# Altium footprint library PR_COR.PcbLib: 73 footprints (part 4 of 5)
Each footprint in its own frame and in the unit in brackets; x right, y up, seen from the top. Pads: shape width x height; smd on the part's side, far side on the other; paste and mask are expansions set on the pad; w line width, h text height; cw(c..) or ccw(c..) is an arc to the next point about the centre after c.
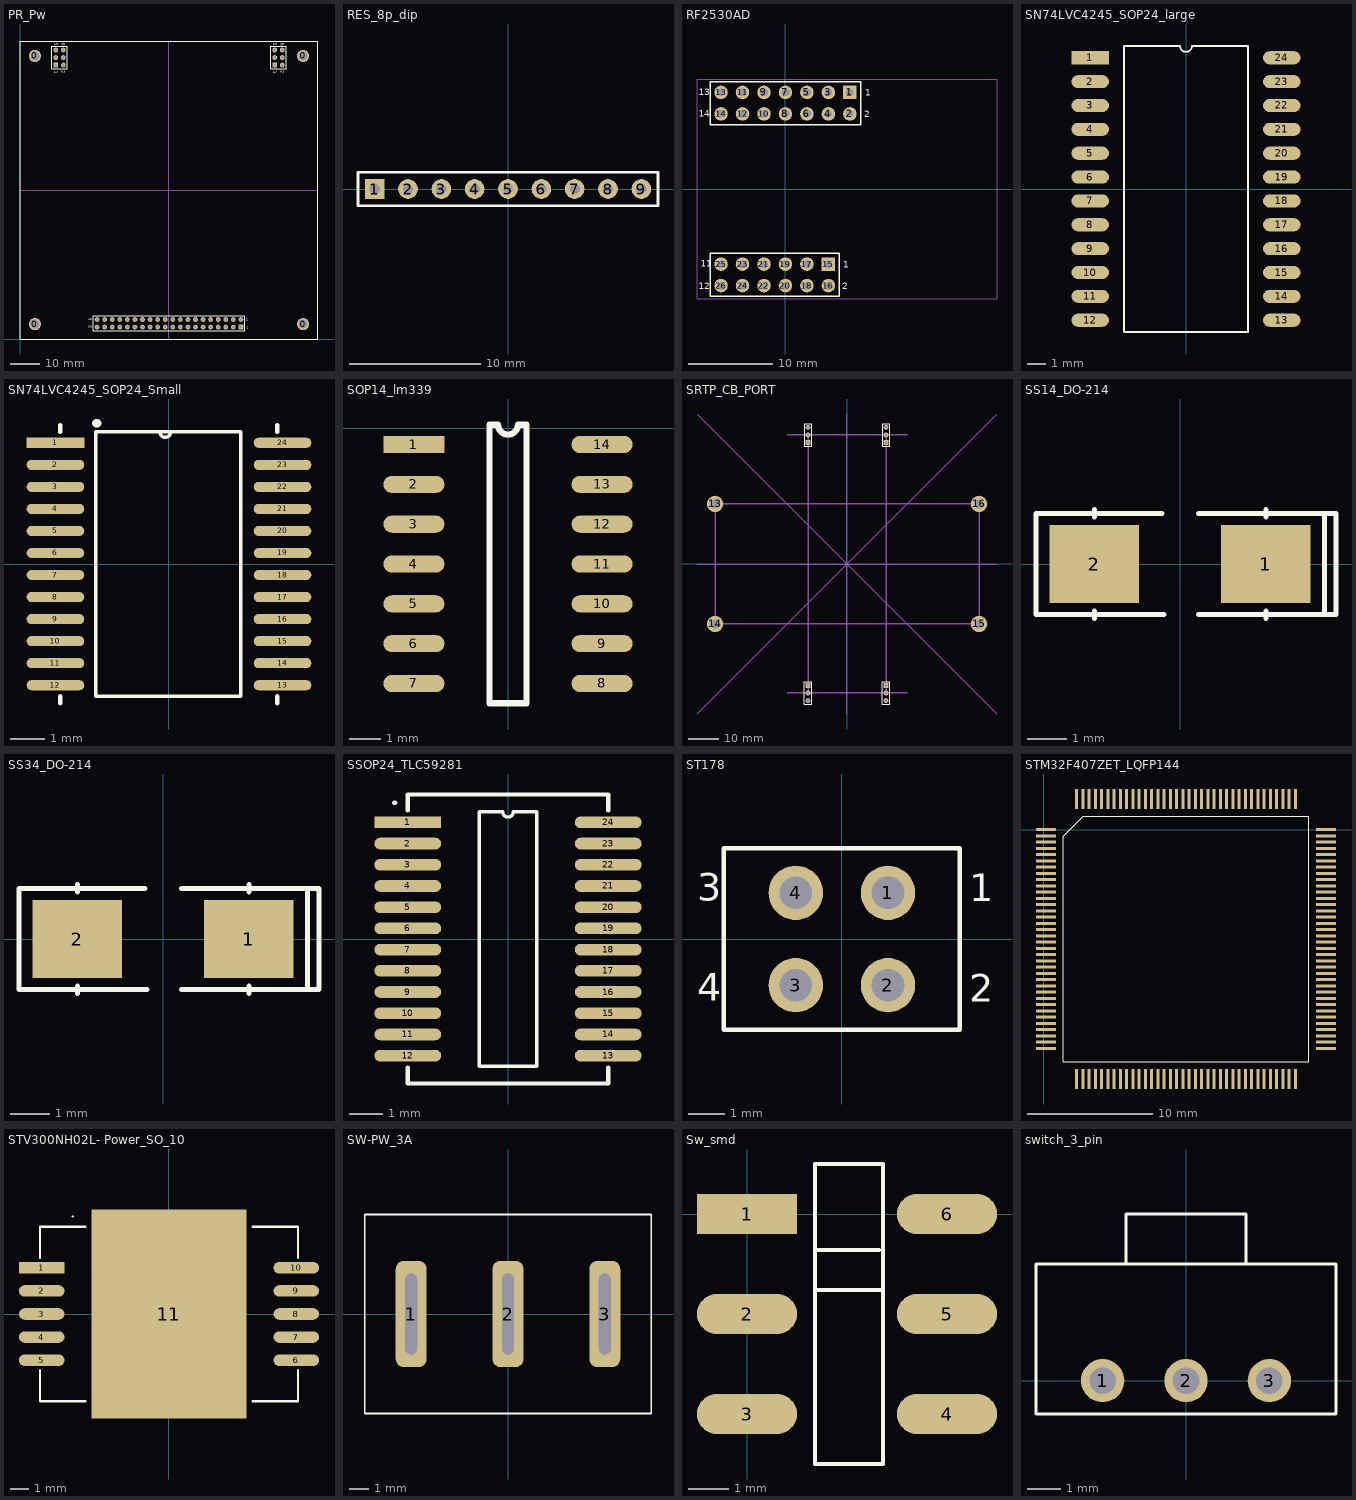
[diagram p3: the footprints below, top view; thin cyan lines are the x and y axes]

## PR_Pw [mm]
pads (56):
  round 4.1 hole 3.1: 0(5,5) 0(5,95) 0(95,5) 0(95,95)
  rect 1.6x1.6 hole 0.9: 1(74.13,4) 41(85.46,91.92) 47(12,91.92)
  round 1.6 hole 0.9: 2(74.13,6.54) 3(71.59,4) 4(71.59,6.54) 5(69.05,4) 6(69.05,6.54) 7(66.51,4) 8(66.51,6.54) 9(63.97,4) 10(63.97,6.54) 11(61.43,4) 12(61.43,6.54) 13(58.89,4) 14(58.89,6.54) 15(56.35,4) 16(56.35,6.54) 17(53.81,4) 18(53.81,6.54) 19(51.27,4) 20(51.27,6.54) 21(48.73,4) 22(48.73,6.54) 23(46.19,4) 24(46.19,6.54) 25(43.65,4) 26(43.65,6.54) 27(41.11,4) 28(41.11,6.54) 29(38.57,4) 30(38.57,6.54) 31(36.03,4) 32(36.03,6.54) 33(33.49,4) 34(33.49,6.54) 35(30.95,4) 36(30.95,6.54) 37(28.41,4) 38(28.41,6.54) 39(25.87,4) 40(25.87,6.54) 42(88,91.92) 43(85.46,94.46) 44(88,94.46) 45(85.46,97) 46(88,97) 48(14.54,91.92) 49(12,94.46) 50(14.54,94.46) 51(12,97) 52(14.54,97)
Top Overlay:
  lines w0.1: 0,0 0,100 100,100 100,0 0,0
  lines w0.2: 10.73,93.402 10.73,98.27 ; 84.19,93.402 84.19,98.27 ; 10.73,98.27 15.81,98.27 15.81,90.65 10.73,90.65 10.73,98.27 ; 84.19,98.27 89.27,98.27 89.27,90.65 84.19,90.65 84.19,98.27 ; 24.6,2.73 75.4,2.73 75.4,7.81 24.6,7.81 24.6,2.73
  text "1" at 84.952,90.078 h1.27
  text "2" at 87.492,90.27 h1.27
  text "5" at 84.952,99.414 h1.27
  text "6" at 87.492,99.414 h1.27
  text "1" at 11.492,90.078 h1.27
  text "2" at 14.032,90.27 h1.27
  text "5" at 11.492,99.414 h1.27
  text "6" at 14.032,99.414 h1.27
  text "1" at 76.03,3.5 h0.76
  text "2" at 75.86,6.1 h0.76
  text "40" at 22.94,6.3 h0.76
  text "39" at 22.948,3.692 h0.76
Bottom Overlay:
  lines w0.2: 24.6,2.73 24.6,7.81 75.4,7.81 75.4,2.73 24.6,2.73
  text "39" at 24.15,3.69 h0.76
  text "40" at 24.15,6.29 h0.76
  text "2" at 76.4,6.1 h0.76
  text "1" at 76.146,3.5 h0.76
Mechanical 2:
  lines w0.1: 0,50 100,50 ; 50,0 50,100
3D body: height 8.02, standoff -2.98, extent 10.73,90.65 15.81,98.27
3D body: height 8.02, standoff -2.98, extent 84.19,90.65 89.27,98.27
3D body: height 8.02, standoff -2.98, extent 24.6,2.73 75.4,7.81

## RES_8p_dip [mm] "Connector; Header; 9 Position"
pads (9):
  rect 1.5x1.5 hole 0.8: 1(-10.16,0)
  round 1.5 hole 0.8: 2(-7.62,0) 3(-5.08,0) 4(-2.54,0) 5(0,0) 6(2.54,0) 7(5.08,0) 8(7.62,0) 9(10.16,0)
Top Overlay:
  lines w0.2: -11.43,-1.27 11.43,-1.27 11.43,1.27 -11.43,1.27 -11.43,-1.27
3D body: height 3.02, standoff -2.48, extent -11.43,-0.75 11.43,0.75

## RF2530AD [mm] "Connector; Header; 14x2 Position"
pads (26):
  rect 1.6x1.6 hole 0.9: 1(7.62,11.42) 15(5.08,-8.88)
  round 1.6 hole 0.9: 2(7.62,8.88) 3(5.08,11.42) 4(5.08,8.88) 5(2.54,11.42) 6(2.54,8.88) 7(0,11.42) 8(0,8.88) 9(-2.54,11.42) 10(-2.54,8.88) 11(-5.08,11.42) 12(-5.08,8.88) 13(-7.62,11.42) 14(-7.62,8.88) 16(5.08,-11.42) 17(2.54,-8.88) 18(2.54,-11.42) 19(0,-8.88) 20(0,-11.42) 21(-2.54,-8.88) 22(-2.54,-11.42) 23(-5.08,-8.88) 24(-5.08,-11.42) 25(-7.62,-8.88) 26(-7.62,-11.42)
Top Overlay:
  lines w0.2: -8.89,-12.69 -8.89,-7.61 6.35,-7.61 6.35,-12.69 -8.89,-12.69 ; -8.89,7.61 -8.89,12.69 8.89,12.69 8.89,7.61 -8.89,7.61
  text "2" at 9.33,8.46 h0.76
  text "1" at 9.44,11.03 h0.76
  text "14" at -10.254,8.57 h0.76
  text "13" at -10.254,11.1 h0.76
  text "12" at -10.254,-11.87 h0.76
  text "11" at -10,-9.21 h0.76
  text "1" at 6.83,-9.31 h0.76
  text "2" at 6.74,-11.86 h0.76
Mechanical 2:
  lines w0.127: -10.46,-13 -10.46,13 25.01,13 25.01,-13 -10.46,-13

## SN74LVC4245_SOP24_large [mm]
pads (24):
  rect 2x0.7 smd: 1(-5.1,6.985)
  oval 2x0.7 smd: 2(-5.1,5.715) 3(-5.1,4.445) 4(-5.1,3.175) 5(-5.1,1.905) 6(-5.1,0.635) 7(-5.1,-0.635) 8(-5.1,-1.905) 9(-5.1,-3.175) 10(-5.1,-4.445) 11(-5.1,-5.715) 12(-5.1,-6.985) 13(5.1,-6.985) 14(5.1,-5.715) 15(5.1,-4.445) 16(5.1,-3.175) 17(5.1,-1.905) 18(5.1,-0.635) 19(5.1,0.635) 20(5.1,1.905) 21(5.1,3.175) 22(5.1,4.445) 23(5.1,5.715) 24(5.1,6.985)
Top Overlay:
  lines w0.1: -3.295,-7.62 3.295,-7.62 3.295,7.62 0.318,7.62 cw(c0,7.62) -0.318,7.62 -3.295,7.62 -3.295,-7.62
3D body: height 1.65, standoff 0, extent -5.1,-7.69 5.2,7.71

## SN74LVC4245_SOP24_Small [mm]
pads (24):
  rect 1.7x0.3 smd: 1(-3.35,3.575)
  oval 1.7x0.3 smd: 2(-3.35,2.925) 3(-3.35,2.275) 4(-3.35,1.625) 5(-3.35,0.975) 6(-3.35,0.325) 7(-3.35,-0.325) 8(-3.35,-0.975) 9(-3.35,-1.625) 10(-3.35,-2.275) 11(-3.35,-2.925) 12(-3.35,-3.575) 13(3.35,-3.575) 14(3.35,-2.925) 15(3.35,-2.275) 16(3.35,-1.625) 17(3.35,-0.975) 18(3.35,-0.325) 19(3.35,0.325) 20(3.35,0.975) 21(3.35,1.625) 22(3.35,2.275) 23(3.35,2.925) 24(3.35,3.575)
Top Overlay:
  lines w0.1: -0.272,3.899 ccw(c-0.11,3.9) 0.053,3.9 ; -2.16,-3.9 -2.16,3.9 2.12,3.9 2.12,-3.9 -2.16,-3.9
  lines w0.127: -3.21,-4.11 -3.21,-3.905 ; -3.21,3.895 -3.21,4.1 ; 3.19,-4.11 3.19,-3.905 ; 3.19,3.895 3.19,4.1
  lines w0.254: -2.15,4.15 -2.12,4.15
3D body: height 0.95, standoff 0, extent -3.21,-3.905 3.19,3.895

## SOP14_lm339 [mm]
pads (14):
  rect 1.95x0.55 smd: 1(-3,-0.525)
  oval 1.95x0.55 smd: 2(-3,-1.795) 3(-3,-3.065) 4(-3,-4.335) 5(-3,-5.605) 6(-3,-6.875) 7(-3,-8.145) 8(3,-8.145) 9(3,-6.875) 10(3,-5.605) 11(3,-4.335) 12(3,-3.065) 13(3,-1.795) 14(3,-0.525)
Top Overlay:
  lines w0.2: -0.59,-8.78 0.59,-8.78 0.59,0.11 0.318,0.11 cw(c0,0.11) -0.317,0.11 -0.59,0.11 -0.59,-8.78
3D body: height 1.67, standoff 0.02, extent -3,-8.65 3,0

## SRTP_CB_PORT [mm]
pads (16):
  round 1.6 hole 0.9: 1(-13,45.54) 2(-13,43) 5(-13,-43) 6(-13,-45.54) 7(13,-45.54) 8(13,-43) 11(13,43) 12(13,45.54)
  rect 1.6x1.6 hole 0.9: 3(-13,40.46) 4(-13,-40.46) 9(13,-40.46) 10(13,40.46)
  round 5.5 hole 3: 13(-44,20) 14(-44,-20) 15(44,-20) 16(44,20)
Top Overlay:
  lines w0.2: -14.27,-46.81 -14.27,-39.19 -11.73,-39.19 -11.73,-46.81 -14.27,-46.81 ; -14.27,39.19 -14.27,46.81 -11.73,46.81 -11.73,39.19 -14.27,39.19 ; 11.73,-46.81 11.73,-39.19 14.27,-39.19 14.27,-46.81 11.73,-46.81 ; 11.73,39.19 11.73,46.81 14.27,46.81 14.27,39.19 11.73,39.19
Mechanical 2:
  lines w0.1: -50.002,-50.002 49.998,49.998 ; -50.002,-0.002 49.998,-0.002 ; -50.002,49.998 49.998,-50.002 ; -0.002,-50.002 -0.002,49.998
  lines w0.5: -44,-20 -44,20 44,20 44,-20 -44,-20
Mechanical 3:
  lines w0.5: -20,-43 20,-43 ; -20,43 20,43 ; -13,-43 -13,43 ; 13,-43 13,43
3D body: height 8.02, standoff -2.98, extent -14.27,39.19 -11.73,46.81
3D body: height 8.02, standoff -2.98, extent -14.27,-46.81 -11.73,-39.19
3D body: height 8.02, standoff -2.98, extent 11.73,-46.81 14.27,-39.19
3D body: height 8.02, standoff -2.98, extent 11.73,39.19 14.27,46.81

## SS14_DO-214 [mm]
height 1
pads (2):
  rect 2.3x2 smd: 1(2.2,0) 2(-2.2,0)
Top Overlay:
  lines w0.127: -2.2,-1.4 -2.2,-1.2 ; -2.2,1.2 -2.2,1.4 ; -0.466,1.3 -3.7,1.3 -3.7,-1.3 -0.416,-1.3 ; 0.47,-1.3 3.7,-1.3 3.7,1.3 ; 0.47,1.3 3.7,1.3 ; 2.2,-1.4 2.2,-1.2 ; 2.2,1.2 2.2,1.4 ; 3.6,-1.3 4,-1.3 4,1.3 3.7,1.3
3D body: height 2.27, standoff 0.02, extent -2.5,-1.35 2.5,1.35

## SS34_DO-214 [mm]
height 1
pads (2):
  rect 2.3x2 smd: 1(2.2,0) 2(-2.2,0)
Top Overlay:
  lines w0.127: -2.2,-1.4 -2.2,-1.2 ; -2.2,1.2 -2.2,1.4 ; -0.466,1.3 -3.7,1.3 -3.7,-1.3 -0.416,-1.3 ; 0.47,-1.3 3.7,-1.3 3.7,1.3 ; 0.47,1.3 3.7,1.3 ; 2.2,-1.4 2.2,-1.2 ; 2.2,1.2 2.2,1.4 ; 3.6,-1.3 4,-1.3 4,1.3 3.7,1.3
3D body: height 2.27, standoff 0.02, extent -2.5,-1.35 2.5,1.35

## SSOP24_TLC59281 [mm]
pads (24):
  rect 2x0.35 smd: 1(-3,3.492)
  oval 2x0.35 smd: 2(-3,2.857) 3(-3,2.222) 4(-3,1.587) 5(-3,0.953) 6(-3,0.318) 7(-3,-0.318) 8(-3,-0.953) 9(-3,-1.587) 10(-3,-2.222) 11(-3,-2.857) 12(-3,-3.492) 13(3,-3.492) 14(3,-2.857) 15(3,-2.222) 16(3,-1.587) 17(3,-0.953) 18(3,-0.318) 19(3,0.318) 20(3,0.953) 21(3,1.587) 22(3,2.222) 23(3,2.857) 24(3,3.492)
Top Overlay:
  lines w0.1: -0.865,-3.81 -0.865,3.81 -0.159,3.81 ccw(c0,3.81) 0.159,3.81 0.865,3.81 0.865,-3.81 -0.865,-3.81
  lines w0.127: -3.41,4.08 -3.38,4.08 ; -3,-3.85 -3,-4.325 -2.995,-4.33 2.58,-4.33 2.995,-4.33 3,-4.325 3,-3.85 ; -3,3.85 -3,4.325 -2.995,4.33 2.58,4.33 2.995,4.33 3,4.325 3,3.85
3D body: height 1.94, standoff 0.02, extent -3,-4.325 3,4.325

## ST178 [mm] "Connector; Header; 2x2 Position"
pads (4):
  round 1.5 hole 0.9: 1(1.27,1.27) 2(1.27,-1.27) 3(-1.27,-1.27) 4(-1.27,1.27)
Top Overlay:
  lines w0.127: -3.25,-2.5 -3.25,2.5 3.25,2.5 3.25,-2.5 -3.25,-2.5
  text "1" at 3.51,1.04 h0.76
  text "2" at 3.51,-1.73 h0.76
  text "4" at -3.99,-1.7 h0.76
  text "3" at -3.99,1.05 h0.76
3D body: height 6.52, standoff -4.98, extent -3.25,-2.5 3.25,2.5

## STM32F407ZET_LQFP144 [mm]
height 1.5
pads (144):
  oval 1.6x0.254 smd: 1(0.2,0)
  rect 1.6x0.254 smd: 2(0.2,-0.5) 3(0.2,-1) 4(0.2,-1.5) 5(0.2,-2) 6(0.2,-2.5) 7(0.2,-3) 8(0.2,-3.5) 9(0.2,-4) 10(0.2,-4.5) 11(0.2,-5) 12(0.2,-5.5) 13(0.2,-6) 14(0.2,-6.5) 15(0.2,-7) 16(0.2,-7.5) 17(0.2,-8) 18(0.2,-8.5) 19(0.2,-9) 20(0.2,-9.5) 21(0.2,-10) 22(0.2,-10.5) 23(0.2,-11) 24(0.2,-11.5) 25(0.2,-12) 26(0.2,-12.5) 27(0.2,-13) 28(0.2,-13.5) 29(0.2,-14) 30(0.2,-14.5) 31(0.2,-15) 32(0.2,-15.5) 33(0.2,-16) 34(0.2,-16.5) 35(0.2,-17) 36(0.2,-17.5) 73(22.6,-17.5) 74(22.6,-17) 75(22.6,-16.5) 76(22.6,-16) 77(22.6,-15.5) 78(22.6,-15) 79(22.6,-14.5) 80(22.6,-14) 81(22.6,-13.5) 82(22.6,-13) 83(22.6,-12.5) 84(22.6,-12) 85(22.6,-11.5) 86(22.6,-11) 87(22.6,-10.5) 88(22.6,-10) 89(22.6,-9.5) 90(22.6,-9) 91(22.6,-8.5) 92(22.6,-8) 93(22.6,-7.5) 94(22.6,-7) 95(22.6,-6.5) 96(22.6,-6) 97(22.6,-5.5) 98(22.6,-5) 99(22.6,-4.5) 100(22.6,-4) 101(22.6,-3.5) 102(22.6,-3) 103(22.6,-2.5) 104(22.6,-2) 105(22.6,-1.5) 106(22.6,-1) 107(22.6,-0.5) 108(22.6,0)
  rect 0.254x1.6 smd: 37(2.65,-19.95) 38(3.15,-19.95) 39(3.65,-19.95) 40(4.15,-19.95) 41(4.65,-19.95) 42(5.15,-19.95) 43(5.65,-19.95) 44(6.15,-19.95) 45(6.65,-19.95) 46(7.15,-19.95) 47(7.65,-19.95) 48(8.15,-19.95) 49(8.65,-19.95) 50(9.15,-19.95) 51(9.65,-19.95) 52(10.15,-19.95) 53(10.65,-19.95) 54(11.15,-19.95) 55(11.65,-19.95) 56(12.15,-19.95) 57(12.65,-19.95) 58(13.15,-19.95) 59(13.65,-19.95) 60(14.15,-19.95) 61(14.65,-19.95) 62(15.15,-19.95) 63(15.65,-19.95) 64(16.15,-19.95) 65(16.65,-19.95) 66(17.15,-19.95) 67(17.65,-19.95) 68(18.15,-19.95) 69(18.65,-19.95) 70(19.15,-19.95) 71(19.65,-19.95) 72(20.15,-19.95) 109(20.15,2.45) 110(19.65,2.45) 111(19.15,2.45) 112(18.65,2.45) 113(18.15,2.45) 114(17.65,2.45) 115(17.15,2.45) 116(16.65,2.45) 117(16.15,2.45) 118(15.65,2.45) 119(15.15,2.45) 120(14.65,2.45) 121(14.15,2.45) 122(13.65,2.45) 123(13.15,2.45) 124(12.65,2.45) 125(12.15,2.45) 126(11.65,2.45) 127(11.15,2.45) 128(10.65,2.45) 129(10.15,2.45) 130(9.65,2.45) 131(9.15,2.45) 132(8.65,2.45) 133(8.15,2.45) 134(7.65,2.45) 135(7.15,2.45) 136(6.65,2.45) 137(6.15,2.45) 138(5.65,2.45) 139(5.15,2.45) 140(4.65,2.45) 141(4.15,2.45) 142(3.65,2.45) 143(3.15,2.45) 144(2.65,2.45)
Top Overlay:
  lines w0.1: 1.585,-18.565 21.215,-18.565 21.215,1.065 3.17,1.065 1.585,-0.52 1.585,-18.565
3D body: height 1.5, standoff 0, extent 0.4,-19.75 22.4,2.25

## STV300NH02L- Power_SO_10 [mm]
pads (11):
  rect 2.5x0.635 smd: 1(-7,2.54)
  oval 2.5x0.635 smd: 2(-7,1.27) 3(-7,0) 4(-7,-1.27) 5(-7,-2.54) 6(7,-2.54) 7(7,-1.27) 8(7,0) 9(7,1.27) 10(7,2.54)
  rect 8.5x11.5 all layers, no hole: 11(0,0)
Top Overlay:
  lines w0.127: -7.1,-3.1 -7.1,-3.6 -7.1,-4.8 -4.6,-4.8 ; -7.1,3.1 -7.1,4.7 -7.1,4.8 -4.6,4.8 ; -5.31,5.36 -5.29,5.36 ; 4.6,-4.8 7.1,-4.8 7.1,-3.6 7.1,-3.1 ; 4.6,4.8 7.1,4.8 7.1,3.1
3D body: height 3.57, standoff 0.02, extent -7.05,-4.75 7.05,4.75

## SW-PW_3A [mm]
pads (3):
  rrect50% 1.6x5.5 hole 0.6 slot 4.2 at 90 deg: 1(-5,0) 2(0,0) 3(5,0)
Top Overlay:
  lines w0.1: -7.4,-5.15 -7.4,5.15 7.4,5.15 7.4,-5.15 -7.4,-5.15
3D body: height 12.9, standoff -4.98, extent -7.4,-5.15 7.4,5.15

## Sw_smd [mm]
pads (6):
  rect 2.5x1 smd: 1(0,0)
  oval 2.5x1 smd: 2(0,-2.5) 3(0,-5) 4(5,-5) 5(5,-2.5) 6(5,0)
Top Overlay:
  lines w0.1: 1.7,-1.9 3.4,-1.9 ; 1.7,-0.9 3.3,-0.9 ; 1.7,-6.25 3.4,-6.25 3.4,1.25 1.7,1.25 1.7,-6.25

## switch_3_pin [mm]
pads (3):
  round 1.3 hole 0.8: 1(-2.5,0) 2(0,0) 3(2.5,0)
Top Overlay:
  lines w0.1: -1.8,3.5 -1.8,5 1.8,5 1.8,3.5 ; -4.5,-1 -4.5,3.5 4.5,3.5 4.5,-1 -4.5,-1